# Altium footprint library Connectors.PcbLib: 164 footprints (part 11 of 11)
Each footprint in its own frame and in the unit in brackets; x right, y up, seen from the top. Pads: shape width x height; smd on the part's side, far side on the other; paste and mask are expansions set on the pad; w line width, h text height; cw(c..) or ccw(c..) is an arc to the next point about the centre after c.
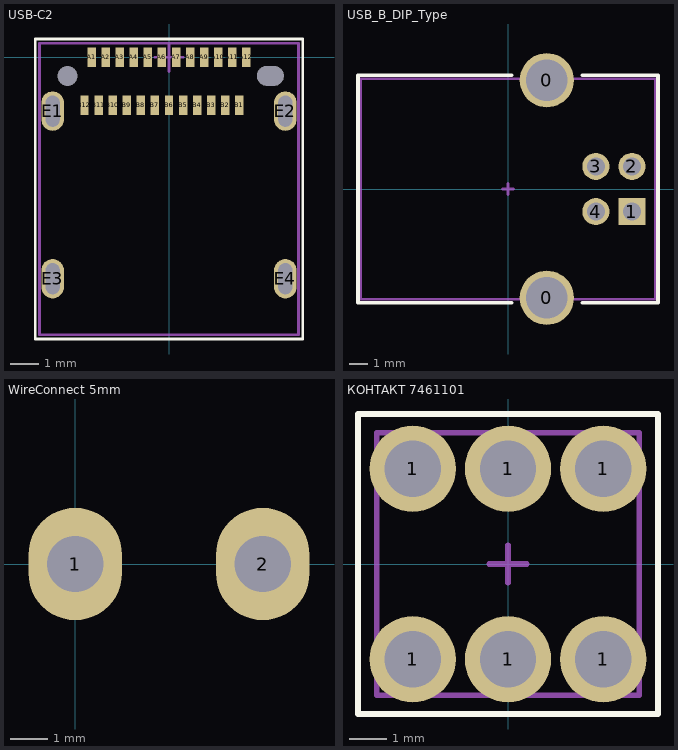
[diagram p10: the footprints below, top view; thin cyan lines are the x and y axes]

## USB-C2 [mm]
pads (30):
  rect 0.3x0.7 smd: A1(-2.75,0) A2(-2.25,0) A3(-1.75,0) A4(-1.25,0) A5(-0.75,0) A6(-0.25,0) A7(0.25,0) A8(0.75,0) A9(1.25,0) A10(1.75,0) A11(2.25,0) A12(2.75,0) B1(2.5,-1.7) B2(2,-1.7) B3(1.5,-1.7) B4(1,-1.7) B5(0.5,-1.7) B6(0,-1.7) B7(-0.5,-1.7) B8(-1,-1.7) B9(-1.5,-1.7) B10(-2,-1.7) B11(-2.5,-1.7) B12(-3,-1.7)
  oval 0.8x1.4 hole 0.5 slot 1.1 at 90 deg: E1(-4.13,-1.91) E2(4.13,-1.91) E3(-4.13,-7.86) E4(4.13,-7.86)
  round 0 hole 0.7 unplated: H1(-3.6,-0.66)
  round 0 hole 0.7 slot 0.95 at 0 deg unplated: H2(3.6,-0.66)
Top Overlay:
  lines w0.1: -4.75,-10 -4.75,0.65 4.75,0.65 4.75,-10 -4.75,-10
Mechanical 15:
  lines w0.1: -0.5,0 0.5,0 ; 0,-0.5 0,0.5 ; -4.6,-9.85 4.6,-9.85 4.6,0.5 -4.6,0.5 -4.6,-9.85

## USB_B_DIP_Type [mm]
height 10.6
pads (6):
  round 3 hole 2.3: 0(2.15,-6.02) 0(2.15,6.02)
  rect 1.5x1.5 hole 1: 1(6.86,-1.25)
  round 1.5 hole 1: 2(6.86,1.25) 3(4.86,1.25) 4(4.86,-1.25)
Top Overlay:
  lines w0.2: 0.2,-6.3 -8.3,-6.3 -8.3,6.3 0.2,6.3 ; 4.1,-6.3 8.3,-6.3 8.3,6.3 4.1,6.3
Mechanical 15:
  lines w0.15: -0.3,0 0.3,0 ; 0,-0.3 0,0.3 ; -8.15,-6.1 -8.15,6.1 8.15,6.1 8.15,-6.1 -8.15,-6.1
3D body "User Library-Samtec - USB-B-S-X-W-TH.STEP": height 11, standoff -3.64, extent -8.2,-7.398 8.3,7.4

## WireConnect 5mm [mm]
pads (2):
  oval 2.5x3 hole 1.5: 1(0,0) 2(5,0)

## КОНТАКТ 7461101 [mm]
pads (6):
  round 2.3 hole 1.5: 1(-2.54,-2.54) 1(-2.54,2.54) 1(0,-2.54) 1(0,2.54) 1(2.54,-2.54) 1(2.54,2.54)
Top Overlay:
  lines w0.15: -4,-4 -4,4 4,4 4,-4 -4,-4
Mechanical 13:
  lines w0.15: -0.5,0 0.5,0 ; 0,-0.5 0,0.5 ; -3.5,-3.5 3.5,-3.5 3.5,3.5 -3.5,3.5 -3.5,-3.5
3D body "КОНТАКТ 7461101.STEP": height 14, standoff -3.5, extent -3.5,-3.5 3.5,3.5